# Altium footprint library cool_library.PcbLib: 1182 footprints (part 35 of 75)
Each footprint in its own frame and in the unit in brackets; x right, y up, seen from the top. Pads: shape width x height; smd on the part's side, far side on the other; paste and mask are expansions set on the pad; w line width, h text height; cw(c..) or ccw(c..) is an arc to the next point about the centre after c.
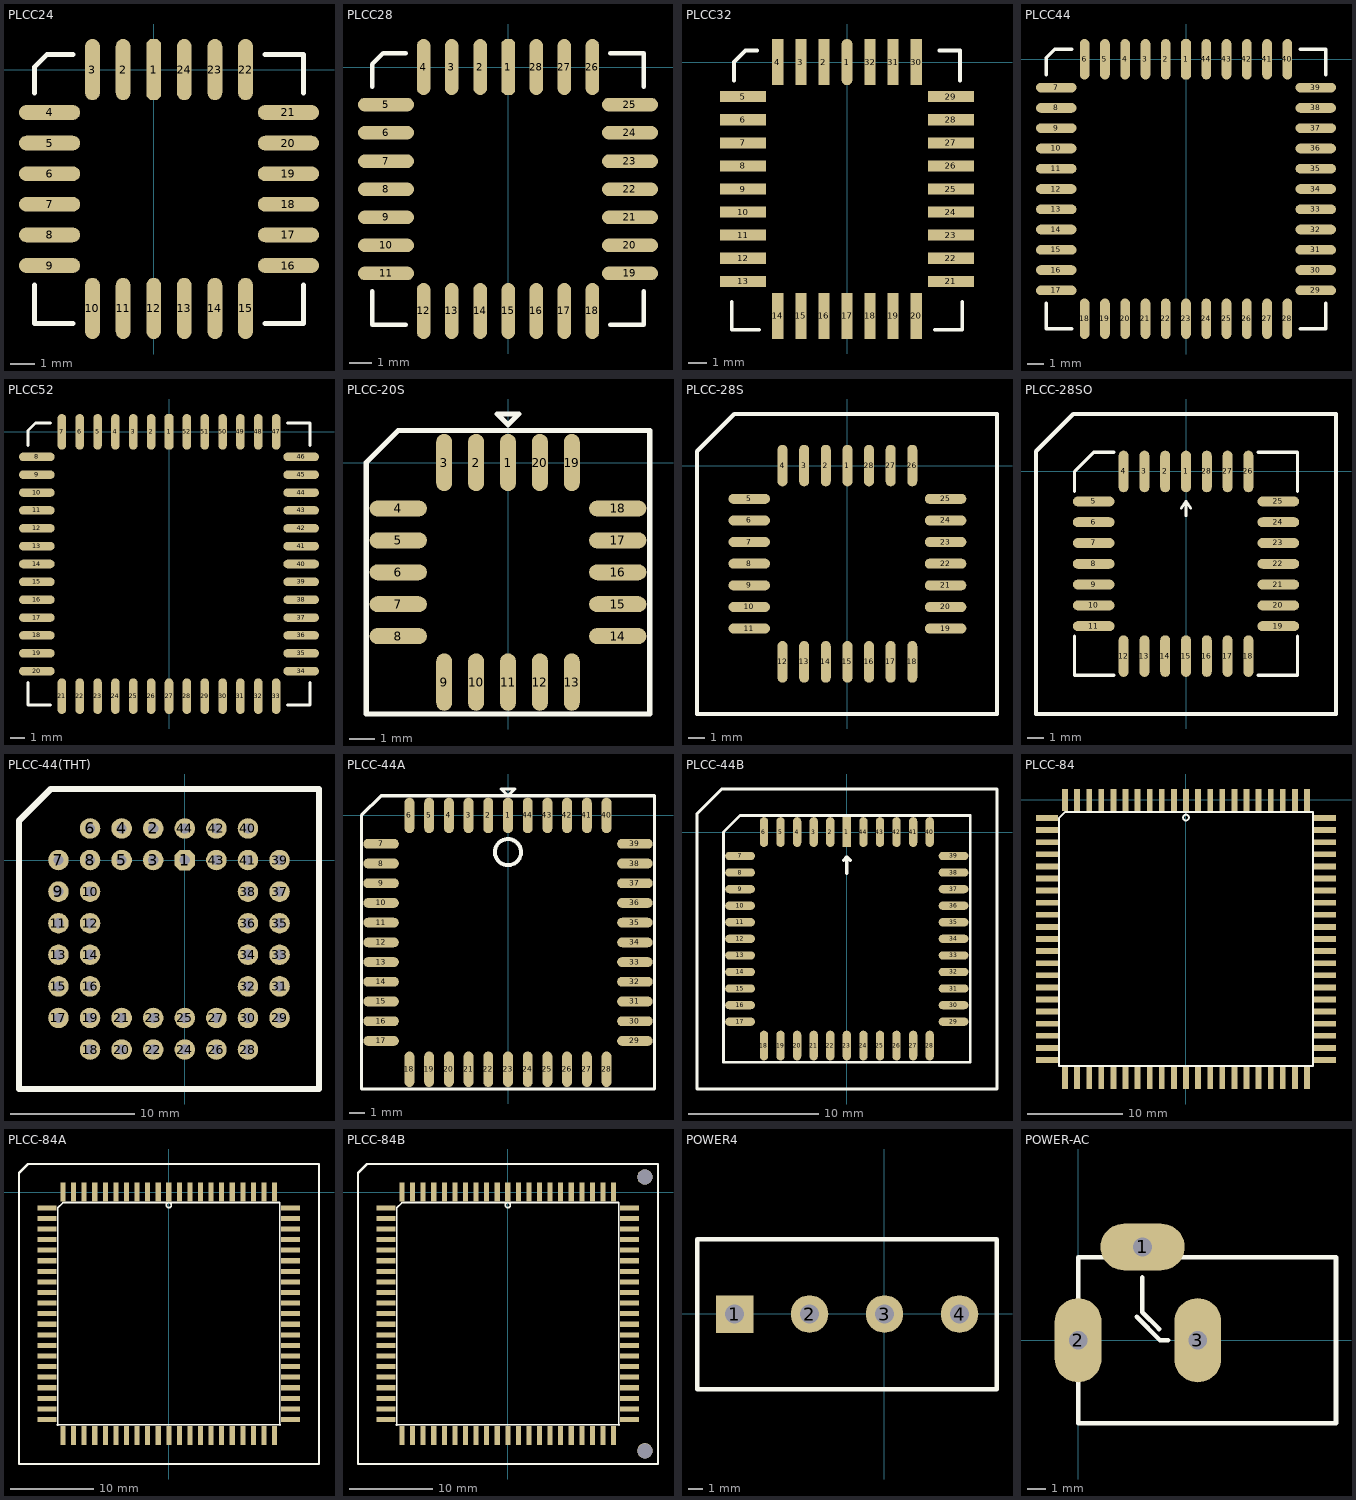
[diagram p34: the footprints below, top view; thin cyan lines are the x and y axes]

## PLCC24 [mil]
pads (24):
  oct 24x100 smd: 1(0,0)
  oval 24x100 smd: 2(-50,0) 3(-100,0) 10(-100,-390) 11(-50,-390) 12(0,-390) 13(50,-390) 14(100,-390) 15(150,-390) 22(150,0) 23(100,0) 24(50,0)
  oval 100x24 smd: 4(-170,-70) 5(-170,-120) 6(-170,-170) 7(-170,-220) 8(-170,-270) 9(-170,-320) 16(220,-320) 17(220,-270) 18(220,-220) 19(220,-170) 20(220,-120) 21(220,-70)
Top Overlay:
  lines w8: -195,-352 -195,-415 -132,-415 ; -195,-38 -195,4 -174,25 -132,25 ; 182,-415 245,-415 245,-352 ; 182,25 245,25 245,-38

## PLCC28 [mil]
pads (28):
  oct 24x100 smd: 1(0,0)
  oval 24x100 smd: 2(-50,0) 3(-101,0) 4(-151,0) 12(-151,-435) 13(-101,-435) 14(-50,-435) 15(0,-435) 16(50,-435) 17(100,-435) 18(150,-435) 26(150,0) 27(100,0) 28(50,0)
  oval 100x24 smd: 5(-218,-67) 6(-218,-117) 7(-218,-168) 8(-218,-218) 9(-218,-268) 10(-218,-318) 11(-218,-368) 19(217,-368) 20(217,-318) 21(217,-268) 22(217,-218) 23(217,-168) 24(217,-117) 25(217,-67)
Top Overlay:
  lines w8: -243,-400 -243,-460 -183,-460 ; -243,-35 -243,5 -223,25 -183,25 ; 182,-460 242,-460 242,-400 ; 182,25 242,25 242,-35

## PLCC32 [mil]
pads (32):
  oval 24x100 smd: 1(0,0)
  rect 24x100 smd: 2(-50,0) 3(-100,0) 4(-150,0) 14(-150,-550) 15(-100,-550) 16(-50,-550) 17(0,-550) 18(50,-550) 19(100,-550) 20(150,-550) 30(150,0) 31(100,0) 32(50,0)
  rect 100x24 smd: 5(-225,-75) 6(-225,-125) 7(-225,-175) 8(-225,-225) 9(-225,-275) 10(-225,-325) 11(-225,-375) 12(-225,-425) 13(-225,-475) 21(225,-475) 22(225,-425) 23(225,-375) 24(225,-325) 25(225,-275) 26(225,-225) 27(225,-175) 28(225,-125) 29(225,-75)
Top Overlay:
  lines w8: -250,-520 -250,-580 -190,-580 ; -245,-40 -245,0 -220,25 -195,25 ; 190,-580 250,-580 250,-520 ; 200,25 245,25 245,-40

## PLCC44 [mil]
pads (44):
  oct 24x100 smd: 1(0,0)
  oval 24x100 smd: 2(-50,0) 3(-100,0) 4(-150,0) 5(-200,0) 6(-250,0) 18(-250,-640) 19(-200,-640) 20(-150,-640) 21(-100,-640) 22(-50,-640) 23(0,-640) 24(50,-640) 25(100,-640) 26(150,-640) 27(200,-640) 28(250,-640) 40(250,0) 41(200,0) 42(150,0) 43(100,0) 44(50,0)
  oval 100x24 smd: 7(-320,-70) 8(-320,-120) 9(-320,-170) 10(-320,-220) 11(-320,-270) 12(-320,-320) 13(-320,-370) 14(-320,-420) 15(-320,-470) 16(-320,-520) 17(-320,-570) 29(320,-570) 30(320,-520) 31(320,-470) 32(320,-420) 33(320,-370) 34(320,-320) 35(320,-270) 36(320,-220) 37(320,-170) 38(320,-120) 39(320,-70)
Top Overlay:
  lines w8: -345,-602 -345,-665 -282,-665 ; -345,-38 -345,4 -324,25 -282,25 ; 282,-665 345,-665 345,-602 ; 282,25 345,25 345,-38

## PLCC52 [mil]
pads (52):
  oct 24x100 smd: 1(0,0)
  oval 24x100 smd: 2(-50,0) 3(-100,0) 4(-150,0) 5(-200,0) 6(-250,0) 7(-300,0) 21(-300,-740) 22(-250,-740) 23(-200,-740) 24(-150,-740) 25(-100,-740) 26(-50,-740) 27(0,-740) 28(50,-740) 29(100,-740) 30(150,-740) 31(200,-740) 32(250,-740) 33(300,-740) 47(300,0) 48(250,0) 49(200,0) 50(150,0) 51(100,0) 52(50,0)
  oval 100x24 smd: 8(-370,-70) 9(-370,-120) 10(-370,-170) 11(-370,-220) 12(-370,-270) 13(-370,-320) 14(-370,-370) 15(-370,-420) 16(-370,-470) 17(-370,-520) 18(-370,-570) 19(-370,-620) 20(-370,-670) 34(370,-670) 35(370,-620) 36(370,-570) 37(370,-520) 38(370,-470) 39(370,-420) 40(370,-370) 41(370,-320) 42(370,-270) 43(370,-220) 44(370,-170) 45(370,-120) 46(370,-70)
Top Overlay:
  lines w8: -395,-702 -395,-765 -332,-765 ; -395,-38 -395,4 -374,25 -332,25 ; 332,-765 395,-765 395,-702 ; 332,25 395,25 395,-38

## PLCC-20S [mil]
pads (20):
  oval 25x90 smd: 1(0,0) 2(-50,0) 3(-100,0) 9(-100,-344) 10(-50,-344) 11(0,-344) 12(50,-344) 13(100,-344) 19(100,0) 20(50,0)
  oval 90x25 smd: 4(-172,-72) 5(-172,-122) 6(-172,-172) 7(-172,-222) 8(-172,-272) 14(172,-272) 15(172,-222) 16(172,-172) 17(172,-122) 18(172,-72)
Top Overlay:
  lines w8: -222,-394 222,-394 222,50 -172,50 -222,0 -222,-394 ; -17,76 0,59 17,76 -17,76

## PLCC-28S [mm]
pads (28):
  oval 0.6x2.5 smd: 1(0,0) 2(-1.3,0) 3(-2.6,0) 4(-3.9,0) 12(-3.9,-11.8) 13(-2.6,-11.8) 14(-1.3,-11.8) 15(0,-11.8) 16(1.3,-11.8) 17(2.6,-11.8) 18(3.9,-11.8) 26(3.9,0) 27(2.6,0) 28(1.3,0)
  oval 2.5x0.6 smd: 5(-5.9,-2) 6(-5.9,-3.3) 7(-5.9,-4.6) 8(-5.9,-5.9) 9(-5.9,-7.2) 10(-5.9,-8.5) 11(-5.9,-9.8) 19(5.9,-9.8) 20(5.9,-8.5) 21(5.9,-7.2) 22(5.9,-5.9) 23(5.9,-4.6) 24(5.9,-3.3) 25(5.9,-2)
Top Overlay:
  lines w0.254: -9.042,-14.935 8.992,-14.935 8.992,3.099 -6.807,3.099 -9.042,0.864 -9.042,-14.935

## PLCC-28SO [mm]
pads (28):
  oval 0.6x2.5 smd: 1(0,0) 2(-1.25,0) 3(-2.5,0) 4(-3.75,0) 12(-3.75,-11.1) 13(-2.5,-11.1) 14(-1.25,-11.1) 15(0,-11.1) 16(1.25,-11.1) 17(2.5,-11.1) 18(3.75,-11.1) 26(3.75,0) 27(2.5,0) 28(1.25,0)
  oval 2.5x0.6 smd: 5(-5.55,-1.8) 6(-5.55,-3.05) 7(-5.55,-4.3) 8(-5.55,-5.55) 9(-5.55,-6.8) 10(-5.55,-8.05) 11(-5.55,-9.3) 19(5.55,-9.3) 20(5.55,-8.05) 21(5.55,-6.8) 22(5.55,-5.55) 23(5.55,-4.3) 24(5.55,-3.05) 25(5.55,-1.8)
Top Overlay:
  lines w0.154: -0.279,-2.21 0,-1.778 ; 0,-2.667 0,-1.778 ; 0.279,-2.21 0,-1.778
  lines w0.2: -6.7,-9.9 -6.7,-12.25 -4.35,-12.25 ; -6.7,-1.2 -6.7,0 -5.55,1.15 -4.35,1.15 ; 4.35,-12.25 6.7,-12.25 6.7,-9.9 ; 4.35,1.15 6.7,1.15 6.7,-1.2
  lines w0.254: -9.017,-14.58 9.017,-14.58 9.017,3.454 -6.782,3.454 -9.017,1.219 -9.017,-14.58

## PLCC-44(THT) [mil]
pads (44):
  oct 65x65 hole 32: 1(0,0)
  round 65 hole 32: 2(-100,100) 3(-100,0) 4(-200,100) 5(-200,0) 6(-300,100) 7(-400,0) 8(-300,0) 9(-400,-100) 10(-300,-100) 11(-400,-200) 12(-300,-200) 13(-400,-300) 14(-300,-300) 15(-400,-400) 16(-300,-400) 17(-400,-500) 18(-300,-600) 19(-300,-500) 20(-200,-600) 21(-200,-500) 22(-100,-600) 23(-100,-500) 24(0,-600) 25(0,-500) 26(100,-600) 27(100,-500) 28(200,-600) 29(300,-500) 30(200,-500) 31(300,-400) 32(200,-400) 33(300,-300) 34(200,-300) 35(300,-200) 36(200,-200) 37(300,-100) 38(200,-100) 39(300,0) 40(200,100) 41(200,0) 42(100,100) 43(100,0) 44(0,100)
Top Overlay:
  lines w20: -25,225 425,225 425,-725 -525,-725 -525,125 -425,225 0,225

## PLCC-44A [mil]
pads (44):
  oval 25x90 smd: 1(0,0) 2(-50,0) 3(-100,0) 4(-150,0) 5(-200,0) 6(-250,0) 18(-250,-644) 19(-200,-644) 20(-150,-644) 21(-100,-644) 22(-50,-644) 23(0,-644) 24(50,-644) 25(100,-644) 26(150,-644) 27(200,-644) 28(250,-644) 40(250,0) 41(200,0) 42(150,0) 43(100,0) 44(50,0)
  oval 90x25 smd: 7(-322,-72) 8(-322,-122) 9(-322,-172) 10(-322,-222) 11(-322,-272) 12(-322,-322) 13(-322,-372) 14(-322,-422) 15(-322,-472) 16(-322,-522) 17(-322,-572) 29(322,-572) 30(322,-522) 31(322,-472) 32(322,-422) 33(322,-372) 34(322,-322) 35(322,-272) 36(322,-222) 37(322,-172) 38(322,-122) 39(322,-72)
Top Overlay:
  lines w8: -372,-694 372,-694 372,50 -322,50 -372,0 -372,-694 ; -17,67 0,67 17,67 0,50 -17,67
  lines w10: 32.87,-90.09 ccw(c-0.12,-93) 33,-93

## PLCC-44B [mil]
pads (44):
  rect 25x90 smd: 1(0,0)
  oval 25x90 smd: 2(-50,0) 3(-100,0) 4(-150,0) 5(-200,0) 6(-250,0) 18(-250,-644) 19(-200,-644) 20(-150,-644) 21(-100,-644) 22(-50,-644) 23(0,-644) 24(50,-644) 25(100,-644) 26(150,-644) 27(200,-644) 28(250,-644) 40(250,0) 41(200,0) 42(150,0) 43(100,0) 44(50,0)
  oval 90x25 smd: 7(-322,-72) 8(-322,-122) 9(-322,-172) 10(-322,-222) 11(-322,-272) 12(-322,-322) 13(-322,-372) 14(-322,-422) 15(-322,-472) 16(-322,-522) 17(-322,-572) 29(322,-572) 30(322,-522) 31(322,-472) 32(322,-422) 33(322,-372) 34(322,-322) 35(322,-272) 36(322,-222) 37(322,-172) 38(322,-122) 39(322,-72)
Top Overlay:
  lines w8: -372,-694 -372,0 -322,50 372,50 372,-694 -372,-694
  lines w10: -10,-85 0,-75 ; 0,-125 0,-75 ; 10,-85 0,-75 ; -452,-775 453,-775 453,130 -377,130 -452,55 -452,-775

## PLCC-84 [mil]
height 100
pads (84):
  rect 24x90 smd: 1(0,0) 2(-49.61,0.28) 3(-99.61,0.28) 4(-149.61,0.28) 5(-199.61,0.28) 6(-249.61,0.28) 7(-299.61,0.28) 8(-349.61,0.28) 9(-399.61,0.28) 10(-449.61,0.28) 11(-499.61,0.28) 33(-499.61,-1149.72) 34(-449.61,-1149.72) 35(-399.61,-1149.72) 36(-349.61,-1149.72) 37(-299.61,-1149.72) 38(-249.61,-1149.72) 39(-199.61,-1149.72) 40(-149.61,-1149.72) 41(-99.61,-1149.72) 42(-49.61,-1149.72) 43(0.39,-1149.72) 44(50.39,-1149.72) 45(100.39,-1149.72) 46(150.39,-1149.72) 47(200.39,-1149.72) 48(250.39,-1149.72) 49(300.39,-1149.72) 50(350.39,-1149.72) 51(400.39,-1149.72) 52(450.39,-1149.72) 53(500.39,-1149.72) 75(500.39,0.28) 76(450.39,0.28) 77(400.39,0.28) 78(350.39,0.28) 79(300.39,0.28) 80(250.39,0.28) 81(200.39,0.28) 82(150.39,0.28) 83(100.39,0.28) 84(50.39,0.28)
  rect 90x24 smd: 12(-574.61,-74.72) 13(-574.61,-124.72) 14(-574.61,-174.72) 15(-574.61,-224.72) 16(-574.61,-274.72) 17(-574.61,-324.72) 18(-574.61,-374.72) 19(-574.61,-424.72) 20(-574.61,-474.72) 21(-574.61,-524.72) 22(-574.61,-574.72) 23(-574.61,-624.72) 24(-574.61,-674.72) 25(-574.61,-724.72) 26(-574.61,-774.72) 27(-574.61,-824.72) 28(-574.61,-874.72) 29(-574.61,-924.72) 30(-574.61,-974.72) 31(-574.61,-1024.72) 32(-574.61,-1074.72) 54(575.39,-1074.72) 55(575.39,-1024.72) 56(575.39,-974.72) 57(575.39,-924.72) 58(575.39,-874.72) 59(575.39,-824.72) 60(575.39,-774.72) 61(575.39,-724.72) 62(575.39,-674.72) 63(575.39,-624.72) 64(575.39,-574.72) 65(575.39,-524.72) 66(575.39,-474.72) 67(575.39,-424.72) 68(575.39,-374.72) 69(575.39,-324.72) 70(575.39,-274.72) 71(575.39,-224.72) 72(575.39,-174.72) 73(575.39,-124.72) 74(575.39,-74.72)
Top Overlay:
  circle w8: c0.39,-72.72 r12
  lines w8: -524.61,-1099.72 525.39,-1099.72 525.39,-49.72 -499.61,-49.72 -524.61,-74.72 -524.61,-1099.72

## PLCC-84A [mil]
height 100
pads (84):
  rect 24x90 smd: 1(0,0) 2(-49.61,0.28) 3(-99.61,0.28) 4(-149.61,0.28) 5(-199.61,0.28) 6(-249.61,0.28) 7(-299.61,0.28) 8(-349.61,0.28) 9(-399.61,0.28) 10(-449.61,0.28) 11(-499.61,0.28) 33(-499.61,-1149.72) 34(-449.61,-1149.72) 35(-399.61,-1149.72) 36(-349.61,-1149.72) 37(-299.61,-1149.72) 38(-249.61,-1149.72) 39(-199.61,-1149.72) 40(-149.61,-1149.72) 41(-99.61,-1149.72) 42(-49.61,-1149.72) 43(0.39,-1149.72) 44(50.39,-1149.72) 45(100.39,-1149.72) 46(150.39,-1149.72) 47(200.39,-1149.72) 48(250.39,-1149.72) 49(300.39,-1149.72) 50(350.39,-1149.72) 51(400.39,-1149.72) 52(450.39,-1149.72) 53(500.39,-1149.72) 75(500.39,0.28) 76(450.39,0.28) 77(400.39,0.28) 78(350.39,0.28) 79(300.39,0.28) 80(250.39,0.28) 81(200.39,0.28) 82(150.39,0.28) 83(100.39,0.28) 84(50.39,0.28)
  rect 90x24 smd: 12(-574.61,-74.72) 13(-574.61,-124.72) 14(-574.61,-174.72) 15(-574.61,-224.72) 16(-574.61,-274.72) 17(-574.61,-324.72) 18(-574.61,-374.72) 19(-574.61,-424.72) 20(-574.61,-474.72) 21(-574.61,-524.72) 22(-574.61,-574.72) 23(-574.61,-624.72) 24(-574.61,-674.72) 25(-574.61,-724.72) 26(-574.61,-774.72) 27(-574.61,-824.72) 28(-574.61,-874.72) 29(-574.61,-924.72) 30(-574.61,-974.72) 31(-574.61,-1024.72) 32(-574.61,-1074.72) 54(575.39,-1074.72) 55(575.39,-1024.72) 56(575.39,-974.72) 57(575.39,-924.72) 58(575.39,-874.72) 59(575.39,-824.72) 60(575.39,-774.72) 61(575.39,-724.72) 62(575.39,-674.72) 63(575.39,-624.72) 64(575.39,-574.72) 65(575.39,-524.72) 66(575.39,-474.72) 67(575.39,-424.72) 68(575.39,-374.72) 69(575.39,-324.72) 70(575.39,-274.72) 71(575.39,-224.72) 72(575.39,-174.72) 73(575.39,-124.72) 74(575.39,-74.72)
Top Overlay:
  circle w8: c0.39,-61.72 r12
  lines w8: -524.61,-1099.72 525.39,-1099.72 525.39,-49.72 -499.61,-49.72 -524.61,-74.72 -524.61,-1099.72
  lines w10: -707.71,89 -707.71,90 ; -524.61,-1099.72 -524.61,-1098.61 ; 525.39,-1100.39 525.39,-1099.72 ; -707.71,90 -665,132.71 710.29,132.71 710.29,-1285.3 -707.71,-1285.3 -707.71,90

## PLCC-84B [mil]
height 100
pads (86):
  rect 24x90 smd: 1(0,0) 2(-49.61,0.28) 3(-99.61,0.28) 4(-149.61,0.28) 5(-199.61,0.28) 6(-249.61,0.28) 7(-299.61,0.28) 8(-349.61,0.28) 9(-399.61,0.28) 10(-449.61,0.28) 11(-499.61,0.28) 33(-499.61,-1149.72) 34(-449.61,-1149.72) 35(-399.61,-1149.72) 36(-349.61,-1149.72) 37(-299.61,-1149.72) 38(-249.61,-1149.72) 39(-199.61,-1149.72) 40(-149.61,-1149.72) 41(-99.61,-1149.72) 42(-49.61,-1149.72) 43(0.39,-1149.72) 44(50.39,-1149.72) 45(100.39,-1149.72) 46(150.39,-1149.72) 47(200.39,-1149.72) 48(250.39,-1149.72) 49(300.39,-1149.72) 50(350.39,-1149.72) 51(400.39,-1149.72) 52(450.39,-1149.72) 53(500.39,-1149.72) 75(500.39,0.28) 76(450.39,0.28) 77(400.39,0.28) 78(350.39,0.28) 79(300.39,0.28) 80(250.39,0.28) 81(200.39,0.28) 82(150.39,0.28) 83(100.39,0.28) 84(50.39,0.28)
  rect 90x24 smd: 12(-574.61,-74.72) 13(-574.61,-124.72) 14(-574.61,-174.72) 15(-574.61,-224.72) 16(-574.61,-274.72) 17(-574.61,-324.72) 18(-574.61,-374.72) 19(-574.61,-424.72) 20(-574.61,-474.72) 21(-574.61,-524.72) 22(-574.61,-574.72) 23(-574.61,-624.72) 24(-574.61,-674.72) 25(-574.61,-724.72) 26(-574.61,-774.72) 27(-574.61,-824.72) 28(-574.61,-874.72) 29(-574.61,-924.72) 30(-574.61,-974.72) 31(-574.61,-1024.72) 32(-574.61,-1074.72) 54(575.39,-1074.72) 55(575.39,-1024.72) 56(575.39,-974.72) 57(575.39,-924.72) 58(575.39,-874.72) 59(575.39,-824.72) 60(575.39,-774.72) 61(575.39,-724.72) 62(575.39,-674.72) 63(575.39,-624.72) 64(575.39,-574.72) 65(575.39,-524.72) 66(575.39,-474.72) 67(575.39,-424.72) 68(575.39,-374.72) 69(575.39,-324.72) 70(575.39,-274.72) 71(575.39,-224.72) 72(575.39,-174.72) 73(575.39,-124.72) 74(575.39,-74.72)
  round 72.83 hole 70.87: ""(648.39,-1222.72) ""(648.39,71.28)
Top Overlay:
  circle w8: c0.39,-61.72 r12
  lines w8: -524.61,-1099.72 525.39,-1099.72 525.39,-49.72 -499.61,-49.72 -524.61,-74.72 -524.61,-1099.72
  lines w10: -707.71,89 -707.71,90 ; -524.61,-1099.72 -524.61,-1098.61 ; 525.39,-1100.39 525.39,-1099.72 ; -707.71,90 -665,132.71 710.29,132.71 710.29,-1285.3 -707.71,-1285.3 -707.71,90

## POWER4 [mm]
pads (4):
  rect 2.54x2.54 hole 1.27: 1(-10.148,-0.006)
  round 2.54 hole 1.27: 2(-5.068,-0.006) 3(0.012,-0.006) 4(5.092,-0.006)
Top Overlay:
  lines w0.305: -12.688,-5.086 7.632,-5.086 7.632,5.074 -12.688,5.074 -12.688,-5.086

## POWER-AC [mil]
pads (3):
  oval 180x100 hole 40: 1(137.79,199.37)
  oval 100x180 hole 40: 2(0,0) 3(255.91,0)
Top Overlay:
  lines w10: 125,50 175,0 192,0 ; 137,134 137,60 173,24 ; -18.48,-59.05 20.89,-59.05 20.89,59.05 -18.48,59.05 -18.48,-59.05 ; 0,-177.16 0,177.16 551.18,177.16 551.18,-177.16 0,-177.16 ; 78.74,177.16 78.74,216.54 196.85,216.54 196.85,177.16 78.74,177.16 ; 235.43,-59.42 274.8,-59.42 274.8,58.69 235.43,58.69 235.43,-59.42
Mechanical 1:
  lines w10: -21,-60.63 -21,59.37 19,59.37 19,-60.63 -21,-60.63 ; 77.8,179.37 77.8,219.37 197.79,219.37 197.79,179.37 77.8,179.37 ; 237,-61 237,59 277,59 277,-61 237,-61